# Altium footprint library Tomra_Cadstar_Footprints.PcbLib: 373 footprints (part 16 of 24)
Each footprint in its own frame and in the unit in brackets; x right, y up, seen from the top. Pads: shape width x height; smd on the part's side, far side on the other; paste and mask are expansions set on the pad; w line width, h text height; cw(c..) or ccw(c..) is an arc to the next point about the centre after c.
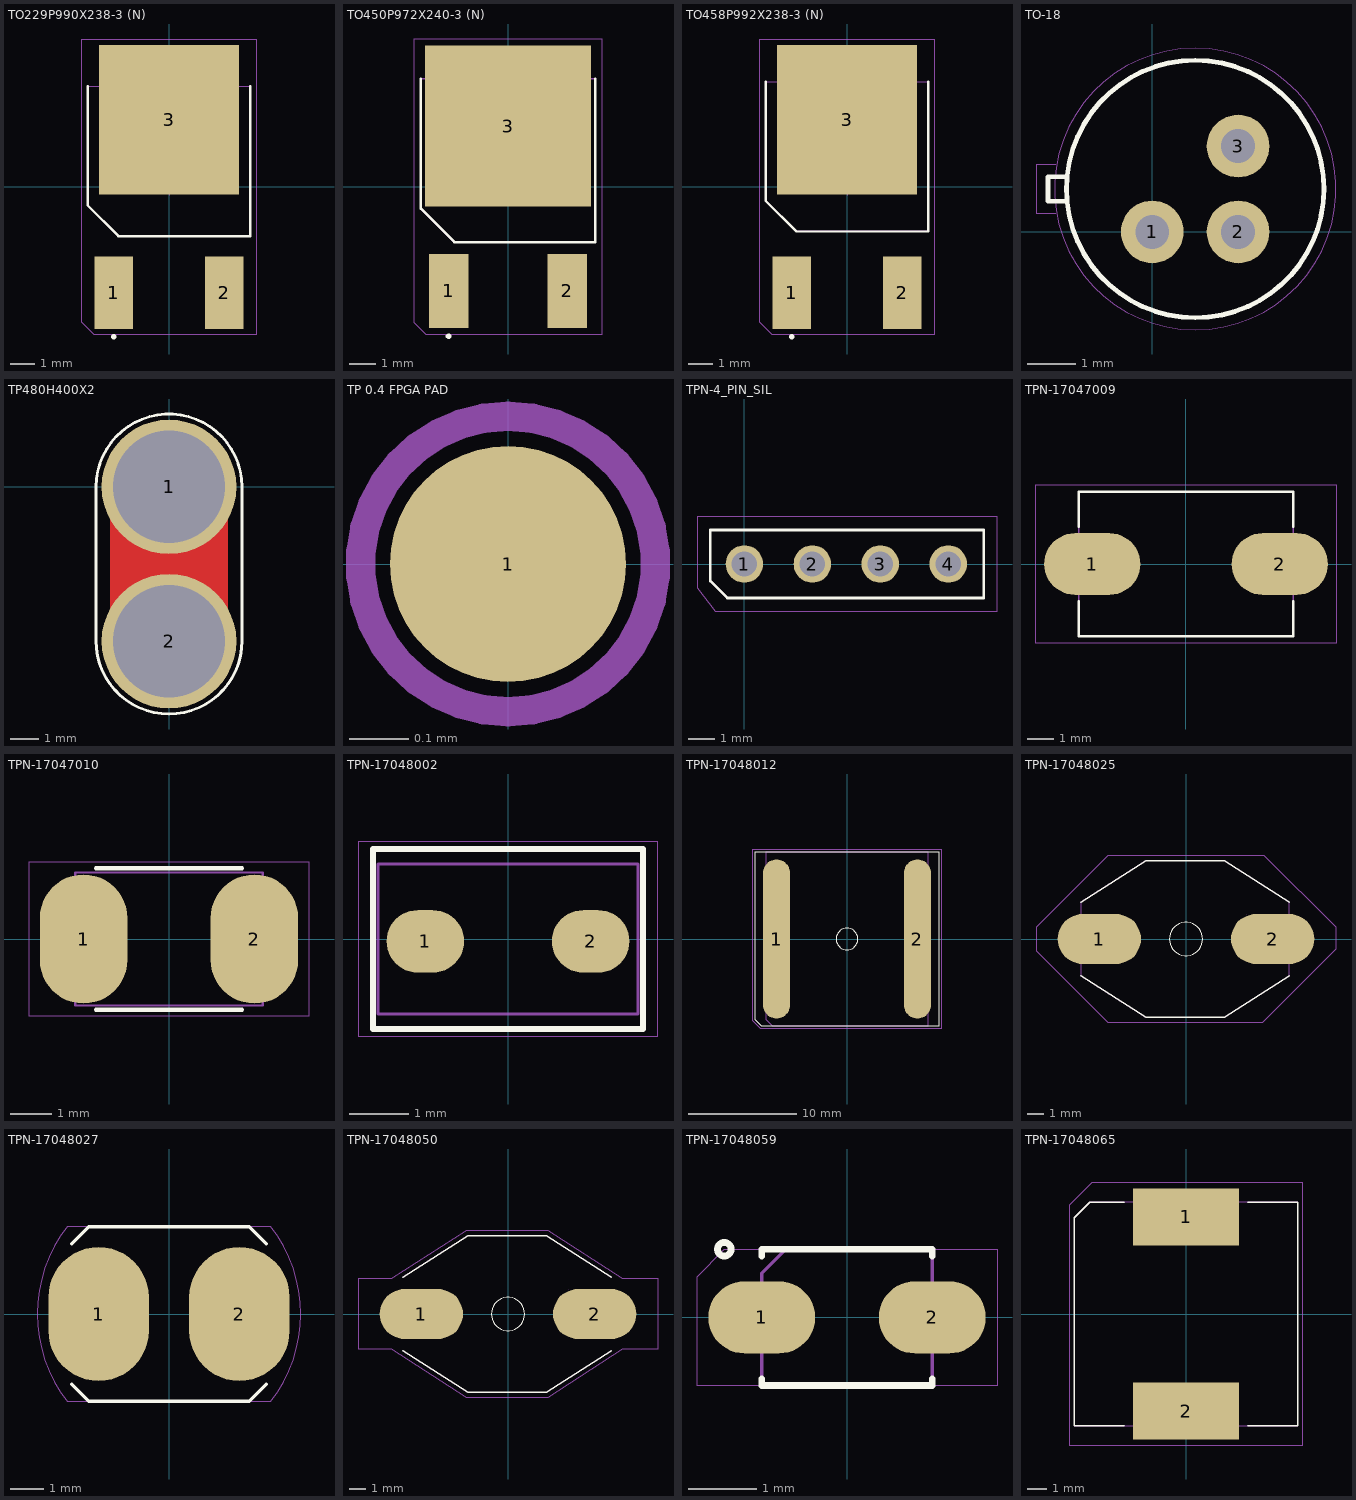
[diagram p15: the footprints below, top view; thin cyan lines are the x and y axes]

## TO229P990X238-3 (N) [mm]
height 2.38
pads (3):
  rect 1.6x3 smd paste+0 mask+0: 1(-2.29,-4.39) 2(2.29,-4.39)
  rect 5.8x6.2 smd paste+0 mask+0: 3(0,2.79)
Top Silk:
  region: -2.39,-6.21 -2.39,-6.169 -2.331,-6.11 -2.249,-6.11 -2.19,-6.169 -2.19,-6.21 -2.19,-6.251 -2.249,-6.31 -2.331,-6.31 -2.39,-6.251
  lines w0.1: -3.37,4.182 -3.37,-0.768 -2.1,-2.038 3.37,-2.038 3.37,4.182
  text ".Designator" at 0,0 h0.7
Top Paste:
  region: 2.615,-0.02 1.265,-0.02 1.265,1.46 2.615,1.46
  region: 2.615,2.05 1.265,2.05 1.265,3.53 2.615,3.53
  region: 2.615,4.12 1.265,4.12 1.265,5.6 2.615,5.6
  region: 0.675,-0.02 -0.675,-0.02 -0.675,1.46 0.675,1.46
  region: 0.675,2.05 -0.675,2.05 -0.675,3.53 0.675,3.53
  region: 0.675,4.12 -0.675,4.12 -0.675,5.6 0.675,5.6
  region: -1.265,-0.02 -2.615,-0.02 -2.615,1.46 -1.265,1.46
  region: -1.265,2.05 -2.615,2.05 -2.615,3.53 -1.265,3.53
  region: -1.265,4.12 -2.615,4.12 -2.615,5.6 -1.265,5.6
Top Assembly:
  lines w0.05: -3.37,-0.768 -2.1,-2.038 3.37,-2.038 3.37,4.182 -3.37,4.182 -3.37,-0.768
Top Placement:
  lines w0.01: -3.62,-5.62 -3.1,-6.14 3.62,-6.14 3.62,6.14 -3.62,6.14 -3.62,-5.62
  lines w0.05: -0.35,0 0.35,0 ; 0,-0.35 0,0.35 ; -0.25,0 cw(c0,0) 0.25,0 cw(c0,0) -0.25,0

## TO450P972X240-3 (N) [mm]
height 2.4
pads (3):
  rect 1.5x2.8 smd paste+0 mask+0: 1(-2.25,-3.95) 2(2.25,-3.95)
  rect 6.3x6.1 smd paste+0 mask+0: 3(0,2.3)
Top Silk:
  region: -2.35,-5.67 -2.35,-5.629 -2.291,-5.57 -2.209,-5.57 -2.15,-5.629 -2.15,-5.67 -2.15,-5.711 -2.209,-5.77 -2.291,-5.77 -2.35,-5.711
  lines w0.1: -3.3,4.1 -3.3,-0.83 -2.03,-2.1 3.3,-2.1 3.3,4.1
  text ".Designator" at -3.55,5.6 h0.7
Top Assembly:
  lines w0.05: -3.3,-0.83 -2.03,-2.1 3.3,-2.1 3.3,4.1 -3.3,4.1 -3.3,-0.83
Top Placement:
  lines w0.01: -0.35,0 0.35,0 ; 0,-0.35 0,0.35 ; -3.55,-5.15 -3.1,-5.6 3.55,-5.6 3.55,5.6 -3.55,5.6 -3.55,-5.15 ; -0.25,0 cw(c0,0) 0.25,0 cw(c0,0) -0.25,0

## TO458P992X238-3 (N) [mm]
height 2.38
pads (3):
  rect 1.6x3 smd paste+0 mask+0: 1(-2.29,-4.39) 2(2.29,-4.39)
  rect 5.8x6.2 smd paste+0 mask+0: 3(0,2.79)
Top Silk:
  region: -2.39,-6.21 -2.39,-6.169 -2.331,-6.11 -2.249,-6.11 -2.19,-6.169 -2.19,-6.21 -2.19,-6.251 -2.249,-6.31 -2.331,-6.31 -2.39,-6.251
  lines w0.1: -3.37,4.372 -3.37,-0.577 -2.1,-1.847 3.37,-1.847 3.37,4.372
  text ".Designator" at 0,0 h0.7
Top Paste:
  region: 2.615,-0.02 1.265,-0.02 1.265,1.46 2.615,1.46
  region: 2.615,2.05 1.265,2.05 1.265,3.53 2.615,3.53
  region: 2.615,4.12 1.265,4.12 1.265,5.6 2.615,5.6
  region: 0.675,-0.02 -0.675,-0.02 -0.675,1.46 0.675,1.46
  region: 0.675,2.05 -0.675,2.05 -0.675,3.53 0.675,3.53
  region: 0.675,4.12 -0.675,4.12 -0.675,5.6 0.675,5.6
  region: -1.265,-0.02 -2.615,-0.02 -2.615,1.46 -1.265,1.46
  region: -1.265,2.05 -2.615,2.05 -2.615,3.53 -1.265,3.53
  region: -1.265,4.12 -2.615,4.12 -2.615,5.6 -1.265,5.6
Top Assembly:
  lines w0.05: -3.37,-0.577 -2.1,-1.847 3.37,-1.847 3.37,4.372 -3.37,4.372 -3.37,-0.577
Top Placement:
  lines w0.01: -3.62,-5.62 -3.1,-6.14 3.62,-6.14 3.62,6.14 -3.62,6.14 -3.62,-5.62
  lines w0.05: -0.35,0 0.35,0 ; 0,-0.35 0,0.35 ; -0.25,0 cw(c0,0) 0.25,0 cw(c0,0) -0.25,0

## TO-18 [mm]
height 8
pads (3):
  round 1.3 / inner round 1.524 / far side round 1.3 hole 0.7 paste+0 mask+0: 1(0,0) 2(1.778,0) 3(1.778,1.778)
Top Silk:
  lines w0.1: -1.778,0.635 -2.159,0.635 -2.159,1.143 -1.778,1.143 ; 0.889,-1.778 cw(c0.889,0.889) 0.889,3.556 cw(c0.889,0.889) 0.889,-1.778
  text ".Designator" at -2.71,0.539 h0.7
Top Assembly:
  lines w0.05: -1.778,0.635 -2.159,0.635 -2.159,1.143 -1.778,1.143 ; 0.889,-1.778 cw(c0.889,0.889) 0.889,3.556 cw(c0.889,0.889) 0.889,-1.778
Top Placement:
  lines w0.01: -1.995,0.39 -2.409,0.385 -2.409,1.393 -1.995,1.39 ; 0.889,-2.028 cw(c0.889,0.889) 0.889,3.806 cw(c0.889,0.889) 0.889,-2.028

## TP480H400X2 [mm]
height 0.1
pads (2):
  round 4.8 / inner round 1.524 / far side round 4.8 hole 4 paste+0 mask+0: 1(0,0) 2(0,-5.5)
Top Elec:
  region: -2.1,-5.5 -2.099,-5.706 -2.016,-6.11 -1.857,-6.49 -1.627,-6.832 -1.334,-7.122 -0.991,-7.35 -0.61,-7.507 -0.206,-7.588 0.206,-7.588 0.61,-7.507 0.991,-7.35 1.334,-7.122 1.627,-6.832 1.857,-6.49 2.016,-6.11 2.099,-5.706 2.1,-5.5 2.1,0 2.1,0.207 2.019,0.613 1.861,0.995 1.631,1.339 1.339,1.631 0.995,1.861 0.613,2.019 0.207,2.1 -0.207,2.1 -0.613,2.019 -0.995,1.861 -1.339,1.631 -1.631,1.339 -1.861,0.995 -2.019,0.613 -2.1,0.207 -2.1,0
Bottom Elec:
  region: -2.1,-5.5 -2.099,-5.706 -2.016,-6.11 -1.857,-6.49 -1.627,-6.832 -1.334,-7.122 -0.991,-7.35 -0.61,-7.507 -0.206,-7.588 0.206,-7.588 0.61,-7.507 0.991,-7.35 1.334,-7.122 1.627,-6.832 1.857,-6.49 2.016,-6.11 2.099,-5.706 2.1,-5.5 2.1,0 2.1,0.207 2.019,0.613 1.861,0.995 1.631,1.339 1.339,1.631 0.995,1.861 0.613,2.019 0.207,2.1 -0.207,2.1 -0.613,2.019 -0.995,1.861 -1.339,1.631 -1.631,1.339 -1.861,0.995 -2.019,0.613 -2.1,0.207 -2.1,0
Top Silk:
  lines w0.1: -2.6,-5.488 ccw(c0,-5.493) 2.6,-5.488 2.6,0.004 ccw(c0,-0.004) -2.6,0.004 -2.6,-5.487
Top Solder Resist:
  region: -2.3,-5.5 -2.3,-5.727 -2.213,-6.172 -2.04,-6.591 -1.788,-6.968 -1.467,-7.289 -1.091,-7.542 -0.672,-7.715 -0.227,-7.804 0.227,-7.804 0.672,-7.715 1.091,-7.542 1.467,-7.289 1.788,-6.968 2.04,-6.591 2.213,-6.172 2.3,-5.727 2.3,-5.5 2.3,0 2.3,0.227 2.213,0.672 2.04,1.091 1.788,1.468 1.467,1.789 1.091,2.042 0.672,2.215 0.227,2.304 -0.227,2.304 -0.672,2.215 -1.091,2.042 -1.467,1.789 -1.788,1.468 -2.04,1.091 -2.213,0.672 -2.3,0.227 -2.3,0
Bottom Solder Resist:
  region: -2.3,-5.5 -2.3,-5.727 -2.213,-6.172 -2.04,-6.591 -1.788,-6.968 -1.467,-7.289 -1.091,-7.542 -0.672,-7.715 -0.227,-7.804 0.227,-7.804 0.672,-7.715 1.091,-7.542 1.467,-7.289 1.788,-6.968 2.04,-6.591 2.213,-6.172 2.3,-5.727 2.3,-5.5 2.3,0 2.3,0.227 2.213,0.672 2.04,1.091 1.788,1.468 1.467,1.789 1.091,2.042 0.672,2.215 0.227,2.304 -0.227,2.304 -0.672,2.215 -1.091,2.042 -1.467,1.789 -1.788,1.468 -2.04,1.091 -2.213,0.672 -2.3,0.227 -2.3,0
Top Assembly:
  lines w0.05: -2.6,-5.488 ccw(c0,-5.493) 2.6,-5.488 2.6,0.004 ccw(c0,-0.004) -2.6,0.004 -2.6,-5.487
  text ".Designator" at -2,2.5 h0.7
Top Placement:
  lines w0.01: -2.6,-5.488 ccw(c0,-5.493) 2.6,-5.488 2.6,0.004 ccw(c0,-0.004) -2.6,0.004 -2.6,-5.487

## TP 0.4 FPGA PAD [mm]
pads (1):
  round 0.4 smd paste+0 mask+0: 1(0,0)
Top Silk:
  text ".Designator" at 0,0.56 h0.7
Top Assembly:
  lines w0.05: 0,-0.25 cw(c0,0) 0,0.25 cw(c0,0) 0,-0.25
Top Placement:
  lines w0.01: 0,-0.25 cw(c0,0) 0,0.25 cw(c0,0) 0,-0.25

## TPN-4_PIN_SIL [mm]
height 9
pads (4):
  round 1.4 / inner round 1.524 / far side round 1.4 hole 0.95 paste+0 mask+0: 1(0,0) 2(2.54,0) 3(5.08,0) 4(7.62,0)
Top Silk:
  lines w0.1: -1.27,-0.635 -0.635,-1.27 8.94,-1.27 8.94,1.27 -1.27,1.27 -1.27,-0.635
  text ".Designator" at 0,0 h0.7
Top Assembly:
  lines w0.05: -1.27,-0.635 -0.635,-1.27 8.94,-1.27 8.94,1.27 -1.27,1.27 -1.27,-0.635
Top Placement:
  lines w0.01: -1.77,-0.885 -1.093,-1.77 9.44,-1.77 9.44,1.77 -1.77,1.77 -1.77,-0.885

## TPN-17047009 [mm]
height 3
pads (2):
  oval 3.6x2.3 smd paste+0 mask+0: 1(-3.5,0) 2(3.5,0)
Top Silk:
  lines w0.1: -4,-1.4 -4,-2.7 4,-2.7 4,-1.4 ; -4,1.4 -4,2.7 4,2.7 4,1.4
  text ".Designator" at -3.9,3 h0.7
Top Assembly:
  lines w0.05: -4,-1.5 -4,2.7 4,2.7 4,-1.4 4,-2.7 -4,-2.7 -4,-1.4
Top Placement:
  lines w0.01: -5.6,-2.95 5.6,-2.95 5.6,2.95 -5.6,2.95 -5.6,-2.95

## TPN-17047010 [mm]
pads (2):
  oval 2.1x3.1 smd paste+0 mask+0: 1(-2.05,0) 2(2.05,0)
Top Silk:
  lines w0.1: -1.75,-1.7 1.75,-1.7 ; -1.75,1.7 1.75,1.7
  text ".Designator" at -2.02,1.945 h0.7
Top Assembly:
  lines w0.05: -2.25,-1.6 2.25,-1.6 2.25,1.6 -2.25,1.6 -2.25,-1.6
Top Placement:
  lines w0.01: -3.35,-1.85 3.35,-1.85 3.35,1.85 -3.35,1.85 -3.35,-1.85

## TPN-17048002 [mm]
pads (2):
  oval 1.314x1.06 smd paste+0 mask+0: 1(-1.4,-0.04) 2(1.4,-0.04)
Top Silk:
  lines w0.1: -2.286,-1.524 2.286,-1.524 2.286,1.524 -2.286,1.524 -2.286,-1.524
  text ".Designator" at -3.599,-0.35 h0.7
Top Assembly:
  lines w0.05: -2.2,-1.27 2.2,-1.27 2.2,1.27 -2.2,1.27 -2.2,-1.27
Top Placement:
  lines w0.01: -2.54,-1.651 2.54,-1.651 2.54,1.651 -2.54,1.651 -2.54,-1.651

## TPN-17048012 [mm]
pads (2):
  oval 2.5x14.692 smd paste+0 mask+0: 1(-6.5,0) 2(6.5,0)
Top Silk:
  lines w0.1: -8.5,-7.4 -7.9,-8 8.5,-8 8.5,8 -8.5,8 -8.5,-7.4 ; 0,-1 cw(c0,0) 0,1 cw(c0,0) 0,-1
  text ".Designator" at -3.599,-0.35 h0.7
Top Assembly:
  lines w0.05: -7.5,-7.4 -6.9,-8 7.5,-8 7.5,8 -7.5,8 -7.5,-7.4
Top Placement:
  lines w0.01: -8.75,-7.5 -8,-8.25 8.75,-8.25 8.75,8.25 -8.75,8.25 -8.75,-7.5

## TPN-17048025 [mm]
height 11.3
pads (2):
  oval 5x3 smd paste+0 mask+0: 1(-5.2,0) 2(5.2,0)
Top Silk:
  lines w0.05: -1,0 ccw(c0,0) 1,0 ccw(c0,0) -1,0
  lines w0.1: -6.3,-2.2 -2.4,-4.7 2.3,-4.7 6.2,-2.2 ; -6.3,2.2 -2.4,4.7 2.3,4.7 6.2,2.2
Top Assembly:
  lines w0.05: -6.3,-2.2 -2.4,-4.7 2.3,-4.7 6.2,-2.2 6.2,2.2 2.3,4.7 -2.4,4.7 -6.3,2.2 -6.3,-2.2
Top Placement:
  lines w0.01: -9,-0.7 -4.7,-5 4.6,-5 9,-0.6 9,0.7 4.7,5 -4.7,5 -9,0.7 -9,-0.7
  lines w0.05: 3.653,1.462 3.655,1.463 3.655,1.464 3.654,1.464 3.654,1.463 3.653,1.462

## TPN-17048027 [mm]
height 4.85
pads (2):
  oval 3x4 smd paste+0 mask+0: 1(-2.1,0) 2(2.1,0)
Top Silk:
  lines w0.1: -2.9,-2.1 -2.4,-2.6 2.4,-2.6 2.9,-2.1 ; -2.9,2.1 -2.4,2.6 2.4,2.6 2.9,2.1
  text ".Designator" at -3.599,-0.35 h0.7
Top Assembly:
  lines w0.05: -2.9,-2.1 -2.4,-2.6 2.4,-2.6 2.9,-2.1 ; -2.9,2.1 -2.4,2.6 2.4,2.6 2.9,2.1
Top Placement:
  lines w0.01: -3.035,-2.6 3.035,-2.6 ccw(c-0.271,0) 3.035,2.6 -3.035,2.6 ccw(c0.271,0) -3.035,-2.6

## TPN-17048050 [mm]
height 11.3
pads (2):
  oval 5x3 smd paste+0 mask+0: 1(-5.2,0) 2(5.2,0)
Top Silk:
  lines w0.05: -1,0 ccw(c0,0) 1,0 ccw(c0,0) -1,0
  lines w0.1: -2.4,-4.7 -6.3,-2.2 -2.4,-4.7 ; -2.4,-4.7 2.3,-4.7 ; -2.4,-4.7 2.3,-4.7 ; -2.4,4.7 2.3,4.7 ; -2.4,4.7 -6.3,2.2 -2.4,4.7 ; -2.4,4.7 2.3,4.7 ; 2.3,-4.7 6.2,-2.2 2.3,-4.7 ; 2.3,4.7 6.2,2.2 2.3,4.7
  text ".Designator" at -2.6,2.471 h0.7
Top Assembly:
  lines w0.05: -6.3,-2.2 -2.4,-4.7 2.3,-4.7 6.2,-2.2 ; -6.3,2.2 -2.4,4.7 2.3,4.7 6.2,2.2
Top Placement:
  lines w0.01: -9,-2.1 -9,2.1 -7,2.1 -2.5,5 2.4,5 6.9,2.1 9,2.1 9,-2.1 6.9,-2.1 2.4,-5 -2.5,-5 -7,-2.1 -9,-2.1
  lines w0.05: 3.653,1.462 3.655,1.463 3.655,1.464 3.654,1.464 3.654,1.463 3.653,1.462

## TPN-17048059 [mm]
height 1.8
pads (2):
  oval 1.568x1.06 smd paste+0 mask+0: 1(-1.25,0) 2(1.25,0)
Top Silk:
  lines w0.1: -1.25,-0.9 -1.25,-1 1.25,-1 1.25,-0.9 ; -1.25,0.9 -1.25,1 1.25,1 1.25,0.9 ; -1.8,0.9 cw(c-1.8,1) -1.8,1.1 cw(c-1.8,1) -1.8,0.9
  text ".Designator" at -3.599,-0.35 h0.7
Top Assembly:
  lines w0.05: -1.25,-1 1.25,-1 1.25,1 -0.9,1 -1.25,0.65 -1.25,-1
Top Placement:
  lines w0.01: -2.2,-1 2.2,-1 2.2,1 -1.8,1 -2.2,0.6 -2.2,-1

## TPN-17048065 [mm]
height 10
pads (2):
  rrect0% 5.4x2.9 smd paste+0 mask+0: 1(0,4.95) 2(0,-4.95)
Top Silk:
  lines w0.1: -3.15,-5.7 -5.7,-5.7 -5.7,4.9 -4.9,5.7 -3.15,5.7 ; 3.15,-5.7 5.7,-5.7 5.7,5.7 3.15,5.7
  text ".Designator" at -3.599,-0.35 h0.7
Top Assembly:
  lines w0.05: -5.7,-5.7 5.7,-5.7 5.7,5.7 -4.9,5.7 -5.7,4.9 -5.7,-5.7
Top Placement:
  lines w0.01: -5.95,-6.7 5.95,-6.7 5.95,6.7 -4.8,6.7 -5.95,5.55 -5.95,-6.7
  lines w0.05: 1.462,-3.653 1.463,-3.655 1.464,-3.655 1.464,-3.654 1.463,-3.654 1.462,-3.653